# Altium footprint library ConnectMedical.PcbLib: 76 footprints (part 2 of 5)
Each footprint in its own frame and in the unit in brackets; x right, y up, seen from the top. Pads: shape width x height; smd on the part's side, far side on the other; paste and mask are expansions set on the pad; w line width, h text height; cw(c..) or ccw(c..) is an arc to the next point about the centre after c.
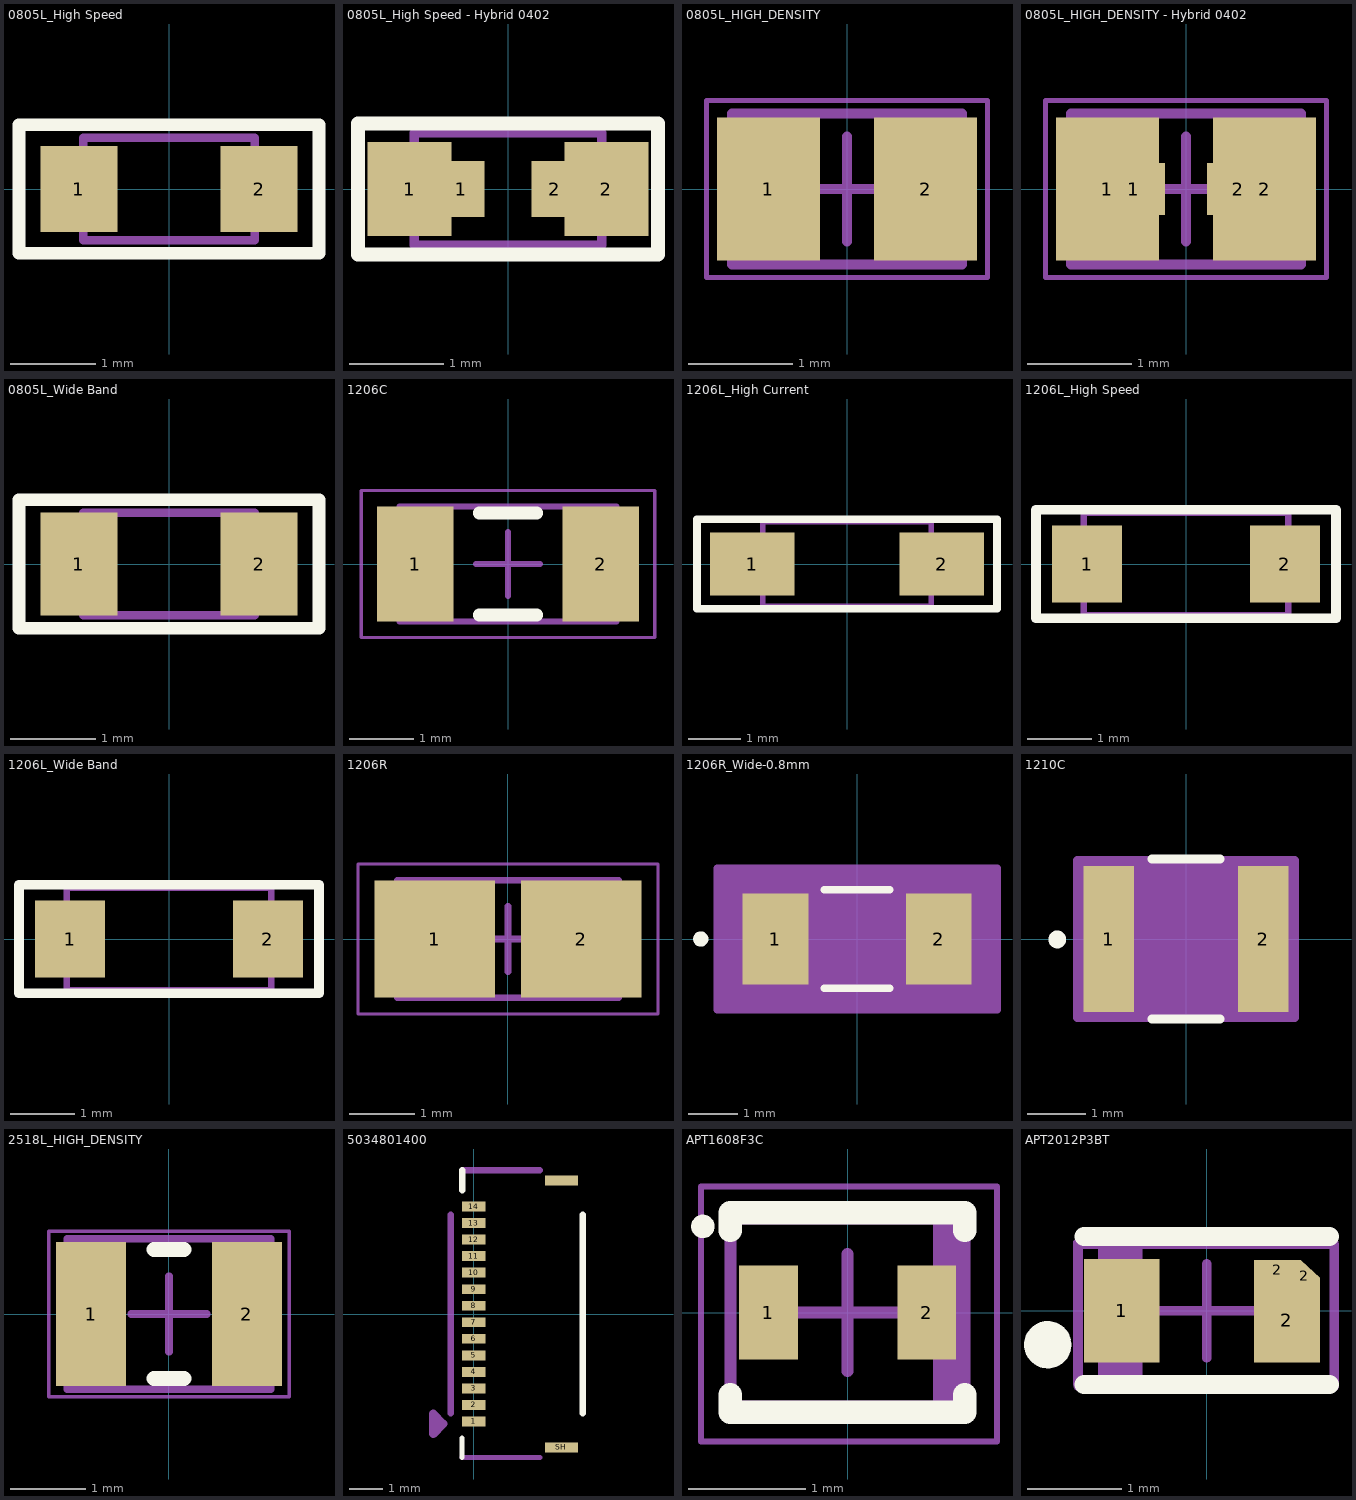
[diagram p1: the footprints below, top view; thin cyan lines are the x and y axes]

## 0805L_High Speed [mm] "SMD EMI Suppression Ferrite  Bead, body 2.0mmx1.2mm"
height 0.9
pads (2):
  rect 0.9x1 smd: 1(-1.05,0) 2(1.05,0)
Top Overlay:
  lines w0.15: -1.75,-0.75 1.75,-0.75 1.75,0.75 -1.75,0.75 -1.75,-0.75
Mechanical 15:
  lines w0.1: -1,-0.6 1,-0.6 1,0.6 -1,0.6 -1,-0.6
3D body "WE-CBF_0805_CBF.stp": height 0.93, standoff 0.03, extent -1,-0.6 1,0.6

## 0805L_High Speed - Hybrid 0402 [mm] "SMD EMI Suppression Ferrite  Bead, body 2.0mmx1.2mm"
height 0.9
pads (4):
  rect 0.9x1 smd: 1(-1.05,0) 2(1.05,0)
  rect 0.5x0.6 smd: 1(-0.5,0) 2(0.5,0)
Top Overlay:
  lines w0.15: -1.6,-0.7 -1.6,0.7 1.6,0.7 1.6,-0.7 -1.6,-0.7
Mechanical 15:
  lines w0.1: -1,-0.6 -1,0.6 1,0.6 1,-0.6 -1,-0.6
3D body "WE-CBF_0805_CBF.stp": height 0.93, standoff 0.03, extent -1,-0.6 1,0.6

## 0805L_HIGH_DENSITY [mm]
height 1.45
pads (2):
  rect 0.99x1.37 smd: 1(-0.755,0) 2(0.755,0)
Mechanical 13:
  lines w0.1: -1.1,-0.725 -1.1,0.725 1.1,0.725 1.1,-0.725 -1.1,-0.725
Mechanical 15:
  lines w0.05: -1.35,-0.85 -1.35,0.85 1.35,0.85 1.35,-0.85 -1.35,-0.85
  lines w0.1: -0.5,0 0.5,0 ; 0,-0.5 0,0.5
3D body "0805L_HIGH_DENSITY.step": height 1.45, standoff 0, extent -1.1,-0.725 1.1,0.725

## 0805L_HIGH_DENSITY - Hybrid 0402 [mm]
height 1.45
pads (4):
  rect 0.99x1.37 smd: 1(-0.755,0) 2(0.755,0)
  rect 0.6x0.5 smd: 1(-0.5,0) 2(0.5,0)
Mechanical 13:
  lines w0.1: -1.1,-0.725 -1.1,0.725 1.1,0.725 1.1,-0.725 -1.1,-0.725
Mechanical 15:
  lines w0.05: -1.35,-0.85 -1.35,0.85 1.35,0.85 1.35,-0.85 -1.35,-0.85
  lines w0.1: -0.5,0 0.5,0 ; 0,-0.5 0,0.5
3D body "0805L_HIGH_DENSITY.step": height 1.45, standoff 0, extent -1.1,-0.725 1.1,0.725

## 0805L_Wide Band [mm] "SMD EMI Suppression Ferrite  Bead, body 2.0mmx1.2mm"
height 0.9
pads (2):
  rect 0.9x1.2 smd: 1(-1.05,0) 2(1.05,0)
Top Overlay:
  lines w0.15: -1.75,-0.75 -1.75,0.75 1.75,0.75 1.75,-0.75 -1.75,-0.75
Mechanical 15:
  lines w0.1: -1,-0.6 -1,0.6 1,0.6 1,-0.6 -1,-0.6
3D body "WE-CBF_0805_CBF.stp": height 0.93, standoff 0.03, extent -1,-0.6 1,0.6

## 1206C [mm] "Chip Capacitor, 2-Leads, Body 3.20x1.60mm, IPC Medium Density"
height 1.2
pads (2):
  rect 1.2x1.8 smd: 1(-1.45,0) 2(1.45,0)
Top Overlay:
  lines w0.2: -0.45,-0.8 0.45,-0.8 ; -0.45,0.8 0.45,0.8
Mechanical 13:
  lines w0.1: -1.7,-0.9 -1.7,0.9 1.7,0.9 1.7,-0.9 -1.7,-0.9
Mechanical 15:
  lines w0.05: -2.3,-1.15 -2.3,1.15 2.3,1.15 2.3,-1.15 -2.3,-1.15
  lines w0.1: -0.5,0 0.5,0 ; 0,-0.5 0,0.5
3D body "C1206.step": height 1.2, standoff 0, extent -1.7,-0.9 1.7,0.9

## 1206L_High Current [mm] "SMD EMI Suppression Ferrite  Bead, body 3.2mmx1.6mm"
height 1.1
pads (2):
  rect 1.6x1.2 smd: 1(-1.8,0) 2(1.8,0)
Top Overlay:
  lines w0.15: -2.85,-0.85 -2.85,0.85 2.85,0.85 2.85,-0.85 -2.85,-0.85
Mechanical 15:
  lines w0.1: -1.6,-0.8 -1.6,0.8 1.6,0.8 1.6,-0.8 -1.6,-0.8
3D body "WE-CBF_1206_CBF.stp": height 1.13, standoff 0.03, extent -1.6,-0.8 1.6,0.8

## 1206L_High Speed [mm] "SMD EMI Suppression Ferrite  Bead, body 3.2mmx1.6mm"
height 1.1
pads (2):
  rect 1.1x1.2 smd: 1(-1.55,0) 2(1.55,0)
Top Overlay:
  lines w0.15: -2.35,-0.85 -2.35,0.85 2.35,0.85 2.35,-0.85 -2.35,-0.85
Mechanical 15:
  lines w0.1: -1.6,-0.8 -1.6,0.8 1.6,0.8 1.6,-0.8 -1.6,-0.8
3D body "WE-CBF_1206_CBF.stp": height 1.13, standoff 0.03, extent -1.6,-0.8 1.6,0.8

## 1206L_Wide Band [mm] "SMD EMI Suppression Ferrite  Bead, body 3.2mmx1.6mm"
height 1.1
pads (2):
  rect 1.1x1.2 smd: 1(-1.55,0) 2(1.55,0)
Top Overlay:
  lines w0.15: -2.35,-0.85 2.35,-0.85 2.35,0.85 -2.35,0.85 -2.35,-0.85
Mechanical 15:
  lines w0.1: -1.6,-0.8 1.6,-0.8 1.6,0.8 -1.6,0.8 -1.6,-0.8
3D body "WE-CBF_1206_CBF.stp": height 1.13, standoff 0.03, extent -1.6,-0.8 1.6,0.8

## 1206R [mm] "Land pattern for 0.005R 1206"
height 0.75
pads (2):
  rect 1.85x1.8 smd: 1(-1.125,0) 2(1.125,0)
Mechanical 13:
  lines w0.1: -1.7,-0.9 -1.7,0.9 1.7,0.9 1.7,-0.9 -1.7,-0.9
Mechanical 15:
  lines w0.05: -2.3,-1.15 -2.3,1.15 2.3,1.15 2.3,-1.15 -2.3,-1.15
  lines w0.1: -0.5,0 0.5,0 ; 0,-0.5 0,0.5
3D body: height 0.75, standoff 0, extent -0.6,-0.9 0.6,0.9
3D body: height 0.75, standoff 0, extent -1.7,-0.9 -0.6,0.9
3D body: height 0.75, standoff 0, extent 0.6,-0.9 1.7,0.9

## 1206R_Wide-0.8mm [mil] "0.126\" L x 0.063\" W x 0.031\"H (3.20mm x 1.60mm x 0.80mm)"
pads (2):
  rect 52x72 smd: 1(-64.5,0) 2(64.5,0)
Top Overlay:
  circle w6: c-123.5,0 r3
  lines w6: -25.75,-39 25.75,-39 ; -25.75,39 25.75,39
Mechanical 13:
  circle w0: c-59.5,0 r3
Mechanical 15:
  region: 110.5,-56 -110.5,-56 -110.5,56 110.5,56
  lines w6: -110.5,-56 110.5,-56 110.5,56 -110.5,56 -110.5,-56
3D body "STA_HVCB1206-M.stp": height 30, standoff 0, extent -68.5,-34 68.5,34

## 1210C [mil]
pads (2):
  rect 34x98 smd: 1(-52,0) 2(52,0)
Top Overlay:
  circle w6: c-86.65,-0.3 r3
  lines w6: -22.89,-54 22.89,-54 ; -22.89,54 22.89,54
Mechanical 13:
  circle w0: c-47,0 r3
Mechanical 15:
  region: 73,-53 -73,-53 -73,53 73,53
  lines w6: -73,-53 -73,53 73,53 73,-53 -73,-53
3D body "G-32-L.stp": height 110, standoff 0, extent -63,-49 63,49

## 2518L_HIGH_DENSITY [mm] "Chip Inductor, 2-Leads, Body 2.50x1.80mm, IPC High Density"
height 2
pads (2):
  rect 0.93x1.92 smd: 1(-1.035,0) 2(1.035,0)
Top Overlay:
  lines w0.2: -0.2,-0.86 0.2,-0.86 ; -0.2,0.86 0.2,0.86
Mechanical 13:
  lines w0.1: -1.35,-1 -1.35,1 1.35,1 1.35,-1 -1.35,-1
Mechanical 15:
  lines w0.05: -1.6,-1.1 -1.6,1.1 1.6,1.1 1.6,-1.1 -1.6,-1.1
  lines w0.1: -0.5,0 0.5,0 ; 0,-0.5 0,0.5
3D body "2518L_HIGH_DENSITY.step": height 2, standoff 0, extent -1.35,-1 1.35,1

## 5034801400 [mm] "Pads for Molex connector to OLED Display using I2C"
pads (16):
  rect 0.7x0.3 smd mask+0.06: 1(0,-3.25) 2(0,-2.75) 3(0,-2.25) 4(0,-1.75) 5(0,-1.25) 6(0,-0.75) 7(0,-0.25) 8(0,0.25) 9(0,0.75) 10(0,1.25) 11(0,1.75) 12(0,2.25) 13(0,2.75) 14(0,3.25)
  rect 1x0.3 smd mask+0.08: SH(2.65,-4.04) ""(2.65,4.04)
Top Overlay:
  lines w0.15: -0.35,-4.35 -0.35,-3.75
  lines w0.2: -0.35,3.75 -0.35,4.35 ; 3.3,-3 3.3,3
Mechanical 15:
  lines w0.15: -0.35,-4.35 2,-4.35
  lines w0.2: -0.7,-3 -0.7,3 ; -0.35,4.35 2,4.35
  lines w0.254: -1.225,-3.625 -0.925,-3.325 -1.225,-3.025 -1.225,-3.625
3D body "5034801400.stp": height 1.88, standoff -0.02, extent -0.325,-4.35 3.275,4.35

## APT1608F3C [mm] "EMITTER IR 940NM 50MA 603"
height 0.75
pads (2):
  rect 0.5x0.8 smd mask+0.05: 1(-0.675,0) 2(0.675,0)
Top Overlay:
  circle w0.1: c-1.235,0.735 r0.05
  lines w0.2: -1,-0.7 -1,-0.85 1,-0.85 1,-0.7 ; -1,0.7 -1,0.85 1,0.85 1,0.7
Mechanical 13:
  rectangle: 0.731,-0.8 1,0.8
  lines w0.1: -1,-0.8 -1,0.8 1,0.8 1,-0.8 -1,-0.8
Mechanical 15:
  lines w0.05: -1.25,-1.1 -1.25,1.075 1.275,1.075 1.275,-1.1 -1.25,-1.1 ; -1.25,-1.1 -1.25,-1.1
  lines w0.1: -0.5,0 0.5,0 ; 0,-0.5 0,0.5
3D body "APT1608 v1-pin.step": height 0.75, standoff -0.01, extent -0.81,-0.4 0.801,0.4

## APT2012P3BT [mm] "PHOTOTRANSISTOR IR NPN 940NM SMD"
height 0.75
pads (4):
  rect 0.8x1.1 smd mask+0.05: 1(-0.9,0)
  rect 0.5x0.2 smd mask+0.05: 2(0.75,0.436)
  rect 0.7x0.9 smd mask+0.05: 2(0.85,-0.1)
  rect 0.275x0.2 smd rot 137 mask+0.05: 2(1.032,0.369)
Top Overlay:
  circle w0.25: c-1.683,-0.359 r0.125
  lines w0.2: -1.3,-0.78 1.3,-0.78 ; -1.3,0.785 1.3,0.785
Mechanical 13:
  rectangle: -1.15,-0.853 -0.679,0.73
  lines w0.1: -1.36,-0.798 -1.36,0.704 1.35,0.704 1.35,-0.798 -1.36,-0.798
Mechanical 15:
  lines w0.05: -1.39,-0.78 -1.39,0.73 1.37,0.73 1.37,-0.78 -1.39,-0.78
  lines w0.1: -0.5,0 0.5,0 ; 0,-0.5 0,0.5
3D body "APT2012 v4.step": height 0.78, standoff 0.02, extent -1,-0.625 1,0.625